# Altium integrated library ALTIUM-PHD_2_54_DUAL_SOCKET_HEADER_6130XX21821.IntLib: 198 symbols (part 1 of 2) (continued)
## 610012243021
designator J?
WR-PHD 2.54 mm SMT Dual Socket Header Bottom Entry, 12p; Part Number: 610012243021; Pin Number: 12; Rated Current: 3A; Working Voltage: 250V AC; Withstanding Voltage: 500V AC; Pitch: 2.54mm; ComponentLink1Description: Manufacturer; ComponentLink1URL: http://www.we-online.de; ComponentLink2Description: Datasheet; ComponentLink2URL: http://katalog.we-online.de/em/datasheet/6100xx243021.pdf; Published Date: August 2017; Publisher: Wurth Elektronik
footprint 610012243021
pins: 1, 2, 3, 4, 5, 6, 7, 8, 9, 10, 11, 12

## 610016243021
designator J?
WR-PHD 2.54 mm SMT Dual Socket Header Bottom Entry, 16p; Part Number: 610016243021; Pin Number: 16; Rated Current: 3A; Working Voltage: 250V AC; Withstanding Voltage: 500V AC; Pitch: 2.54mm; ComponentLink1Description: Manufacturer; ComponentLink1URL: http://www.we-online.de; ComponentLink2Description: Datasheet; ComponentLink2URL: http://katalog.we-online.de/em/datasheet/6100xx243021.pdf; Published Date: August 2017; Publisher: Wurth Elektronik
footprint 610016243021
pins: 1, 2, 3, 4, 5, 6, 7, 8, 9, 10, 11, 12, 13, 14, 15, 16

## 610018243021
designator J?
WR-PHD 2.54 mm SMT Dual Socket Header Bottom Entry, 18p; Part Number: 610018243021; Pin Number: 18; Rated Current: 3A; Working Voltage: 250V AC; Withstanding Voltage: 500V AC; Pitch: 2.54mm; ComponentLink1Description: Manufacturer; ComponentLink1URL: http://www.we-online.de; ComponentLink2Description: Datasheet; ComponentLink2URL: http://katalog.we-online.de/em/datasheet/6100xx243021.pdf; Published Date: August 2017; Publisher: Wurth Elektronik
footprint 610018243021
pins: 1, 2, 3, 4, 5, 6, 7, 8, 9, 10, 11, 12, 13, 14, 15, 16, 17, 18

## 610020243021
designator J?
WR-PHD 2.54 mm SMT Dual Socket Header Bottom Entry, 20p; Part Number: 610020243021; Pin Number: 20; Rated Current: 3A; Working Voltage: 250V AC; Withstanding Voltage: 500V AC; Pitch: 2.54mm; ComponentLink1Description: Manufacturer; ComponentLink1URL: http://www.we-online.de; ComponentLink2Description: Datasheet; ComponentLink2URL: http://katalog.we-online.de/em/datasheet/6100xx243021.pdf; Published Date: August 2017; Publisher: Wurth Elektronik
footprint 610020243021
pins: 1, 2, 3, 4, 5, 6, 7, 8, 9, 10, 11, 12, 13, 14, 15, 16, 17, 18, 19, 20

## 610022243021
designator J?
WR-PHD 2.54 mm SMT Dual Socket Header Bottom Entry, 22p; Part Number: 610022243021; Pin Number: 22; Rated Current: 3A; Working Voltage: 250V AC; Withstanding Voltage: 500V AC; Pitch: 2.54mm; ComponentLink1Description: Manufacturer; ComponentLink1URL: http://www.we-online.de; ComponentLink2Description: Datasheet; ComponentLink2URL: http://katalog.we-online.de/em/datasheet/6100xx243021.pdf; Published Date: August 2017; Publisher: Wurth Elektronik
footprint 610022243021
pins: 1, 2, 3, 4, 5, 6, 7, 8, 9, 10, 11, 12, 13, 14, 15, 16, 17, 18, 19, 20, 21, 22

## 610024243021
designator J?
WR-PHD 2.54 mm SMT Dual Socket Header Bottom Entry, 24p; Part Number: 610024243021; Pin Number: 24; Rated Current: 3A; Working Voltage: 250V AC; Withstanding Voltage: 500V AC; Pitch: 2.54mm; ComponentLink1Description: Manufacturer; ComponentLink1URL: http://www.we-online.de; ComponentLink2Description: Datasheet; ComponentLink2URL: http://katalog.we-online.de/em/datasheet/6100xx243021.pdf; Published Date: August 2017; Publisher: Wurth Elektronik
footprint 610024243021
pins: 1, 2, 3, 4, 5, 6, 7, 8, 9, 10, 11, 12, 13, 14, 15, 16, 17, 18, 19, 20, 21, 22, 23, 24

## 610026243021
designator J?
WR-PHD 2.54 mm SMT Dual Socket Header Bottom Entry, 26p; Part Number: 610026243021; Pin Number: 26; Rated Current: 3A; Working Voltage: 250V AC; Withstanding Voltage: 500V AC; Pitch: 2.54mm; ComponentLink1Description: Manufacturer; ComponentLink1URL: http://www.we-online.de; ComponentLink2Description: Datasheet; ComponentLink2URL: http://katalog.we-online.de/em/datasheet/6100xx243021.pdf; Published Date: August 2017; Publisher: Wurth Elektronik
footprint 610026243021
pins: 1, 2, 3, 4, 5, 6, 7, 8, 9, 10, 11, 12, 13, 14, 15, 16, 17, 18, 19, 20, 21, 22, 23, 24, 25, 26

## 610032243021
designator J?
WR-PHD 2.54 mm SMT Dual Socket Header Bottom Entry, 32p; Part Number: 610032243021; Pin Number: 32; Rated Current: 3A; Working Voltage: 250V AC; Withstanding Voltage: 500V AC; Pitch: 2.54mm; ComponentLink1Description: Manufacturer; ComponentLink1URL: http://www.we-online.de; ComponentLink2Description: Datasheet; ComponentLink2URL: http://katalog.we-online.de/em/datasheet/6100xx243021.pdf; Published Date: August 2017; Publisher: Wurth Elektronik
footprint 610032243021
pins: 1, 2, 3, 4, 5, 6, 7, 8, 9, 10, 11, 12, 13, 14, 15, 16, 17, 18, 19, 20, 21, 22, 23, 24, 25, 26, 27, 28, 29, 30, 31, 32

## 610034243021
designator J?
WR-PHD 2.54 mm SMT Dual Socket Header Bottom Entry, 34p; Part Number: 610034243021; Pin Number: 34; Rated Current: 3A; Working Voltage: 250V AC; Withstanding Voltage: 500V AC; Pitch: 2.54mm; ComponentLink1Description: Manufacturer; ComponentLink1URL: http://www.we-online.de; ComponentLink2Description: Datasheet; ComponentLink2URL: http://katalog.we-online.de/em/datasheet/6100xx243021.pdf; Published Date: August 2017; Publisher: Wurth Elektronik
footprint 610034243021
pins: 1, 2, 3, 4, 5, 6, 7, 8, 9, 10, 11, 12, 13, 14, 15, 16, 17, 18, 19, 20, 21, 22, 23, 24, 25, 26, 27, 28, 29, 30, 31, 32, 33, 34


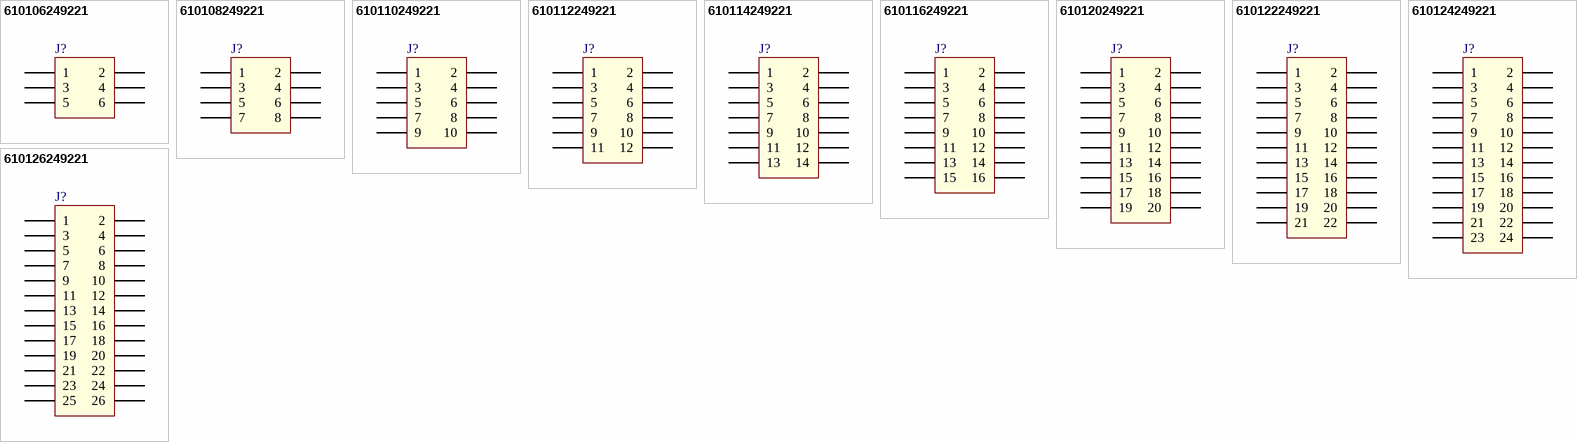
[diagram p4: symbols 610106249221 to 610126249221]

## 610106249221
designator J?
WR-PHD 2.54 mm PCB Socket Header, SMT Type, Double Row, Right Angle, 6p; Part Number: 610106249221; Pin Number: 6; Rated Current: 3A; Working Voltage: 250V AC; Withstanding Voltage: 600V AC; Pitch: 2.54mm; ComponentLink1Description: Manufacturer; ComponentLink1URL: http://www.we-online.de; ComponentLink2Description: Datasheet; ComponentLink2URL: http://katalog.we-online.de/em/datasheet/6101xx249221.pdf; Published Date: August 2017; Publisher: Wurth Elektronik
footprint 610106249221
pins: 1, 2, 3, 4, 5, 6

## 610108249221
designator J?
WR-PHD 2.54 mm PCB Socket Header, SMT Type, Double Row, Right Angle, 8p; Part Number: 610108249221; Pin Number: 8; Rated Current: 3A; Working Voltage: 250V AC; Withstanding Voltage: 600V AC; Pitch: 2.54mm; ComponentLink1Description: Manufacturer; ComponentLink1URL: http://www.we-online.de; ComponentLink2Description: Datasheet; ComponentLink2URL: http://katalog.we-online.de/em/datasheet/6101xx249221.pdf; Published Date: August 2017; Publisher: Wurth Elektronik
footprint 610108249221
pins: 1, 2, 3, 4, 5, 6, 7, 8

## 610110249221
designator J?
WR-PHD 2.54 mm PCB Socket Header, SMT Type, Double Row, Right Angle, 10p; Part Number: 610110249221; Pin Number: 10; Rated Current: 3A; Working Voltage: 250V AC; Withstanding Voltage: 600V AC; Pitch: 2.54mm; ComponentLink1Description: Manufacturer; ComponentLink1URL: http://www.we-online.de; ComponentLink2Description: Datasheet; ComponentLink2URL: http://katalog.we-online.de/em/datasheet/6101xx249221.pdf; Published Date: August 2017; Publisher: Wurth Elektronik
footprint 610110249221
pins: 1, 2, 3, 4, 5, 6, 7, 8, 9, 10

## 610112249221
designator J?
WR-PHD 2.54 mm PCB Socket Header, SMT Type, Double Row, Right Angle, 12p; Part Number: 610112249221; Pin Number: 12; Rated Current: 3A; Working Voltage: 250V AC; Withstanding Voltage: 600V AC; Pitch: 2.54mm; ComponentLink1Description: Manufacturer; ComponentLink1URL: http://www.we-online.de; ComponentLink2Description: Datasheet; ComponentLink2URL: http://katalog.we-online.de/em/datasheet/6101xx249221.pdf; Published Date: August 2017; Publisher: Wurth Elektronik
footprint 610112249221
pins: 1, 2, 3, 4, 5, 6, 7, 8, 9, 10, 11, 12

## 610114249221
designator J?
WR-PHD 2.54 mm PCB Socket Header, SMT Type, Double Row, Right Angle, 14p; Part Number: 610114249221; Pin Number: 14; Rated Current: 3A; Working Voltage: 250V AC; Withstanding Voltage: 600V AC; Pitch: 2.54mm; ComponentLink1Description: Manufacturer; ComponentLink1URL: http://www.we-online.de; ComponentLink2Description: Datasheet; ComponentLink2URL: http://katalog.we-online.de/em/datasheet/6101xx249221.pdf; Published Date: August 2017; Publisher: Wurth Elektronik
footprint 610114249221
pins: 1, 2, 3, 4, 5, 6, 7, 8, 9, 10, 11, 12, 13, 14

## 610116249221
designator J?
WR-PHD 2.54 mm PCB Socket Header, SMT Type, Double Row, Right Angle, 16p; Part Number: 610116249221; Pin Number: 16; Rated Current: 3A; Working Voltage: 250V AC; Withstanding Voltage: 600V AC; Pitch: 2.54mm; ComponentLink1Description: Manufacturer; ComponentLink1URL: http://www.we-online.de; ComponentLink2Description: Datasheet; ComponentLink2URL: http://katalog.we-online.de/em/datasheet/6101xx249221.pdf; Published Date: August 2017; Publisher: Wurth Elektronik
footprint 610116249221
pins: 1, 2, 3, 4, 5, 6, 7, 8, 9, 10, 11, 12, 13, 14, 15, 16

## 610120249221
designator J?
WR-PHD 2.54 mm PCB Socket Header, SMT Type, Double Row, Right Angle, 20p; Part Number: 610120249221; Pin Number: 20; Rated Current: 3A; Working Voltage: 250V AC; Withstanding Voltage: 600V AC; Pitch: 2.54mm; ComponentLink1Description: Manufacturer; ComponentLink1URL: http://www.we-online.de; ComponentLink2Description: Datasheet; ComponentLink2URL: http://katalog.we-online.de/em/datasheet/6101xx249221.pdf; Published Date: August 2017; Publisher: Wurth Elektronik
footprint 610120249221
pins: 1, 2, 3, 4, 5, 6, 7, 8, 9, 10, 11, 12, 13, 14, 15, 16, 17, 18, 19, 20

## 610122249221
designator J?
WR-PHD 2.54 mm PCB Socket Header, SMT Type, Double Row, Right Angle, 22p; Part Number: 610122249221; Pin Number: 22; Rated Current: 3A; Working Voltage: 250V AC; Withstanding Voltage: 600V AC; Pitch: 2.54mm; ComponentLink1Description: Manufacturer; ComponentLink1URL: http://www.we-online.de; ComponentLink2Description: Datasheet; ComponentLink2URL: http://katalog.we-online.de/em/datasheet/6101xx249221.pdf; Published Date: August 2017; Publisher: Wurth Elektronik
footprint 610122249221
pins: 1, 2, 3, 4, 5, 6, 7, 8, 9, 10, 11, 12, 13, 14, 15, 16, 17, 18, 19, 20, 21, 22

## 610124249221
designator J?
WR-PHD 2.54 mm PCB Socket Header, SMT Type, Double Row, Right Angle, 24p; Part Number: 610124249221; Pin Number: 24; Rated Current: 3A; Working Voltage: 250V AC; Withstanding Voltage: 600V AC; Pitch: 2.54mm; ComponentLink1Description: Manufacturer; ComponentLink1URL: http://www.we-online.de; ComponentLink2Description: Datasheet; ComponentLink2URL: http://katalog.we-online.de/em/datasheet/6101xx249221.pdf; Published Date: August 2017; Publisher: Wurth Elektronik
footprint 610124249221
pins: 1, 2, 3, 4, 5, 6, 7, 8, 9, 10, 11, 12, 13, 14, 15, 16, 17, 18, 19, 20, 21, 22, 23, 24

## 610126249221
designator J?
WR-PHD 2.54 mm PCB Socket Header, SMT Type, Double Row, Right Angle, 26p; Part Number: 610126249221; Pin Number: 26; Rated Current: 3A; Working Voltage: 250V AC; Withstanding Voltage: 600V AC; Pitch: 2.54mm; ComponentLink1Description: Manufacturer; ComponentLink1URL: http://www.we-online.de; ComponentLink2Description: Datasheet; ComponentLink2URL: http://katalog.we-online.de/em/datasheet/6101xx249221.pdf; Published Date: August 2017; Publisher: Wurth Elektronik
footprint 610126249221
pins: 1, 2, 3, 4, 5, 6, 7, 8, 9, 10, 11, 12, 13, 14, 15, 16, 17, 18, 19, 20, 21, 22, 23, 24, 25, 26


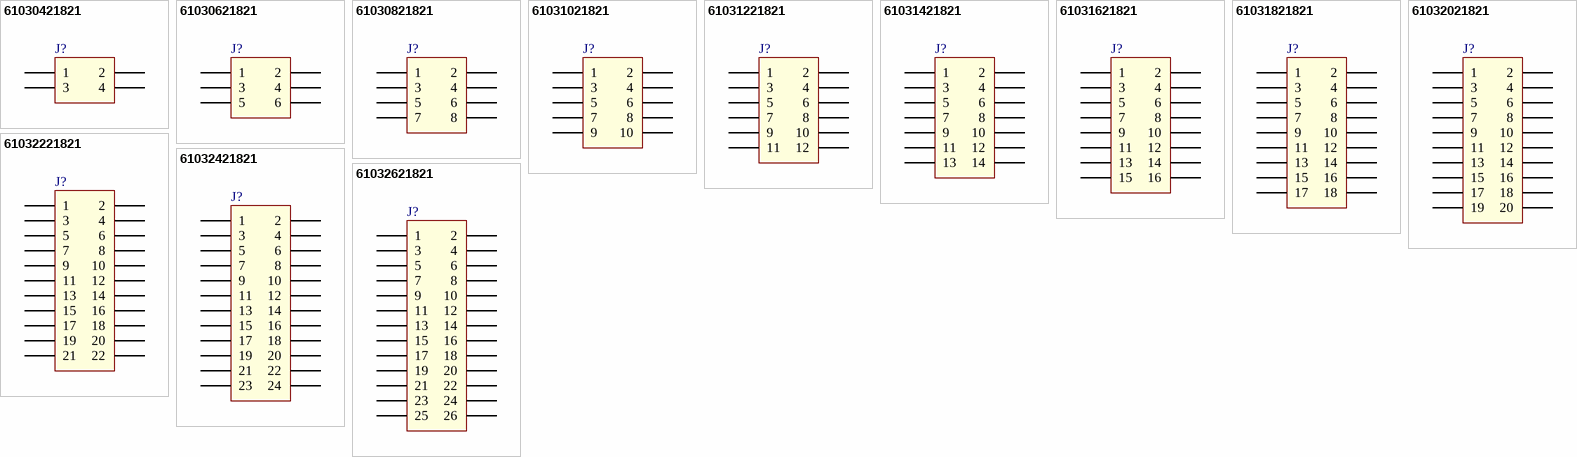
[diagram p5: symbols 61030421821 to 61032621821]

## 61030421821
designator J?
WR-PHD 2.54 mm Dual SMT Socket Header, 4p; Part Number: 61030421821; Pin Number: 4; Rated Current: 3A; Working Voltage: 250V AC; Withstanding Voltage: 600V AC; Pitch: 2.54mm; ComponentLink1Description: Manufacturer; ComponentLink1URL: http://www.we-online.de; ComponentLink2Description: Datasheet; ComponentLink2URL: http://katalog.we-online.de/em/datasheet/6103xx21821.pdf; Published Date: August 2017; Publisher: Wurth Elektronik
footprint 61030421821
pins: 1, 2, 3, 4

## 61030621821
designator J?
WR-PHD 2.54 mm Dual SMT Socket Header, 6p; Part Number: 61030621821; Pin Number: 6; Rated Current: 3A; Working Voltage: 250V AC; Withstanding Voltage: 600V AC; Pitch: 2.54mm; ComponentLink1Description: Manufacturer; ComponentLink1URL: http://www.we-online.de; ComponentLink2Description: Datasheet; ComponentLink2URL: http://katalog.we-online.de/em/datasheet/6103xx21821.pdf; Published Date: August 2017; Publisher: Wurth Elektronik
footprint 61030621821
pins: 1, 2, 3, 4, 5, 6

## 61030821821
designator J?
WR-PHD 2.54 mm Dual SMT Socket Header, 8p; Part Number: 61030821821; Pin Number: 8; Rated Current: 3A; Working Voltage: 250V AC; Withstanding Voltage: 600V AC; Pitch: 2.54mm; ComponentLink1Description: Manufacturer; ComponentLink1URL: http://www.we-online.de; ComponentLink2Description: Datasheet; ComponentLink2URL: http://katalog.we-online.de/em/datasheet/6103xx21821.pdf; Published Date: August 2017; Publisher: Wurth Elektronik
footprint 61030821821
pins: 1, 2, 3, 4, 5, 6, 7, 8

## 61031021821
designator J?
WR-PHD 2.54 mm Dual SMT Socket Header, 10p; Part Number: 61031021821; Pin Number: 10; Rated Current: 3A; Working Voltage: 250V AC; Withstanding Voltage: 600V AC; Pitch: 2.54mm; ComponentLink1Description: Manufacturer; ComponentLink1URL: http://www.we-online.de; ComponentLink2Description: Datasheet; ComponentLink2URL: http://katalog.we-online.de/em/datasheet/6103xx21821.pdf; Published Date: August 2017; Publisher: Wurth Elektronik
footprint 61031021821
pins: 1, 2, 3, 4, 5, 6, 7, 8, 9, 10

## 61031221821
designator J?
WR-PHD 2.54 mm Dual SMT Socket Header, 12p; Part Number: 61031221821; Pin Number: 12; Rated Current: 3A; Working Voltage: 250V AC; Withstanding Voltage: 600V AC; Pitch: 2.54mm; ComponentLink1Description: Manufacturer; ComponentLink1URL: http://www.we-online.de; ComponentLink2Description: Datasheet; ComponentLink2URL: http://katalog.we-online.de/em/datasheet/6103xx21821.pdf; Published Date: August 2017; Publisher: Wurth Elektronik
footprint 61031221821
pins: 1, 2, 3, 4, 5, 6, 7, 8, 9, 10, 11, 12

## 61031421821
designator J?
WR-PHD 2.54 mm Dual SMT Socket Header, 14p; Part Number: 61031421821; Pin Number: 14; Rated Current: 3A; Working Voltage: 250V AC; Withstanding Voltage: 600V AC; Pitch: 2.54mm; ComponentLink1Description: Manufacturer; ComponentLink1URL: http://www.we-online.de; ComponentLink2Description: Datasheet; ComponentLink2URL: http://katalog.we-online.de/em/datasheet/6103xx21821.pdf; Published Date: August 2017; Publisher: Wurth Elektronik
footprint 61031421821
pins: 1, 2, 3, 4, 5, 6, 7, 8, 9, 10, 11, 12, 13, 14

## 61031621821
designator J?
WR-PHD 2.54 mm Dual SMT Socket Header, 16p; Part Number: 61031621821; Pin Number: 16; Rated Current: 3A; Working Voltage: 250V AC; Withstanding Voltage: 600V AC; Pitch: 2.54mm; ComponentLink1Description: Manufacturer; ComponentLink1URL: http://www.we-online.de; ComponentLink2Description: Datasheet; ComponentLink2URL: http://katalog.we-online.de/em/datasheet/6103xx21821.pdf; Published Date: August 2017; Publisher: Wurth Elektronik
footprint 61031621821
pins: 1, 2, 3, 4, 5, 6, 7, 8, 9, 10, 11, 12, 13, 14, 15, 16

## 61031821821
designator J?
WR-PHD 2.54 mm Dual SMT Socket Header, 18p; Part Number: 61031821821; Pin Number: 18; Rated Current: 3A; Working Voltage: 250V AC; Withstanding Voltage: 600V AC; Pitch: 2.54mm; ComponentLink1Description: Manufacturer; ComponentLink1URL: http://www.we-online.de; ComponentLink2Description: Datasheet; ComponentLink2URL: http://katalog.we-online.de/em/datasheet/6103xx21821.pdf; Published Date: August 2017; Publisher: Wurth Elektronik
footprint 61031821821
pins: 1, 2, 3, 4, 5, 6, 7, 8, 9, 10, 11, 12, 13, 14, 15, 16, 17, 18

## 61032021821
designator J?
WR-PHD 2.54 mm Dual SMT Socket Header, 20p; Part Number: 61032021821; Pin Number: 20; Rated Current: 3A; Working Voltage: 250V AC; Withstanding Voltage: 600V AC; Pitch: 2.54mm; ComponentLink1Description: Manufacturer; ComponentLink1URL: http://www.we-online.de; ComponentLink2Description: Datasheet; ComponentLink2URL: http://katalog.we-online.de/em/datasheet/6103xx21821.pdf; Published Date: August 2017; Publisher: Wurth Elektronik
footprint 61032021821
pins: 1, 2, 3, 4, 5, 6, 7, 8, 9, 10, 11, 12, 13, 14, 15, 16, 17, 18, 19, 20

## 61032221821
designator J?
WR-PHD 2.54 mm Dual SMT Socket Header, 22p; Part Number: 61032221821; Pin Number: 22; Rated Current: 3A; Working Voltage: 250V AC; Withstanding Voltage: 600V AC; Pitch: 2.54mm; ComponentLink1Description: Manufacturer; ComponentLink1URL: http://www.we-online.de; ComponentLink2Description: Datasheet; ComponentLink2URL: http://katalog.we-online.de/em/datasheet/6103xx21821.pdf; Published Date: August 2017; Publisher: Wurth Elektronik
footprint 61032221821
pins: 1, 2, 3, 4, 5, 6, 7, 8, 9, 10, 11, 12, 13, 14, 15, 16, 17, 18, 19, 20, 21, 22

## 61032421821
designator J?
WR-PHD 2.54 mm Dual SMT Socket Header, 24p; Part Number: 61032421821; Pin Number: 24; Rated Current: 3A; Working Voltage: 250V AC; Withstanding Voltage: 600V AC; Pitch: 2.54mm; ComponentLink1Description: Manufacturer; ComponentLink1URL: http://www.we-online.de; ComponentLink2Description: Datasheet; ComponentLink2URL: http://katalog.we-online.de/em/datasheet/6103xx21821.pdf; Published Date: August 2017; Publisher: Wurth Elektronik
footprint 61032421821
pins: 1, 2, 3, 4, 5, 6, 7, 8, 9, 10, 11, 12, 13, 14, 15, 16, 17, 18, 19, 20, 21, 22, 23, 24

## 61032621821
designator J?
WR-PHD 2.54 mm Dual SMT Socket Header, 26p; Part Number: 61032621821; Pin Number: 26; Rated Current: 3A; Working Voltage: 250V AC; Withstanding Voltage: 600V AC; Pitch: 2.54mm; ComponentLink1Description: Manufacturer; ComponentLink1URL: http://www.we-online.de; ComponentLink2Description: Datasheet; ComponentLink2URL: http://katalog.we-online.de/em/datasheet/6103xx21821.pdf; Published Date: August 2017; Publisher: Wurth Elektronik
footprint 61032621821
pins: 1, 2, 3, 4, 5, 6, 7, 8, 9, 10, 11, 12, 13, 14, 15, 16, 17, 18, 19, 20, 21, 22, 23, 24, 25, 26


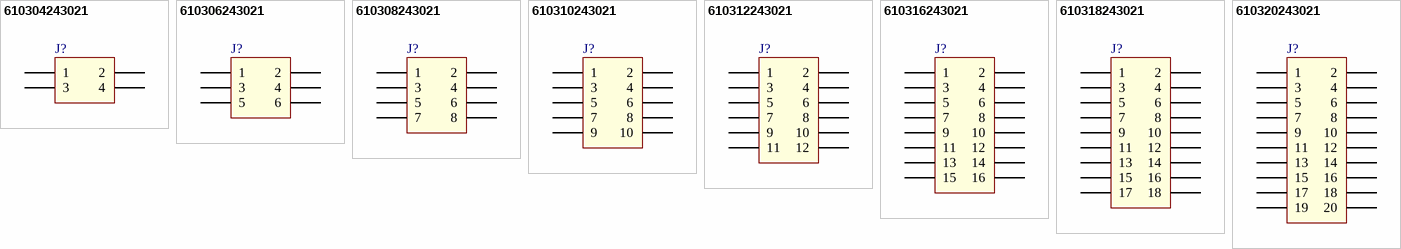
[diagram p6: symbols 610304243021 to 610320243021]

## 610304243021
designator J?
WR-PHD 2.54 mm SMT Dual Socket Header Bottom Entry, 4p; Part Number: 610304243021; Pin Number: 4; Rated Current: 3A; Working Voltage: 250V AC; Withstanding Voltage: 500V AC; Pitch: 2.54mm; ComponentLink1Description: Manufacturer; ComponentLink1URL: http://www.we-online.de; ComponentLink2Description: Datasheet; ComponentLink2URL: http://katalog.we-online.de/em/datasheet/6103xx243021.pdf; Published Date: August 2017; Publisher: Wurth Elektronik
footprint 610304243021
pins: 1, 2, 3, 4

## 610306243021
designator J?
WR-PHD 2.54 mm SMT Dual Socket Header Bottom Entry, 6p; Part Number: 610306243021; Pin Number: 6; Rated Current: 3A; Working Voltage: 250V AC; Withstanding Voltage: 500V AC; Pitch: 2.54mm; ComponentLink1Description: Manufacturer; ComponentLink1URL: http://www.we-online.de; ComponentLink2Description: Datasheet; ComponentLink2URL: http://katalog.we-online.de/em/datasheet/6103xx243021.pdf; Published Date: August 2017; Publisher: Wurth Elektronik
footprint 610306243021
pins: 1, 2, 3, 4, 5, 6

## 610308243021
designator J?
WR-PHD 2.54 mm SMT Dual Socket Header Bottom Entry, 8p; Part Number: 610308243021; Pin Number: 8; Rated Current: 3A; Working Voltage: 250V AC; Withstanding Voltage: 500V AC; Pitch: 2.54mm; ComponentLink1Description: Manufacturer; ComponentLink1URL: http://www.we-online.de; ComponentLink2Description: Datasheet; ComponentLink2URL: http://katalog.we-online.de/em/datasheet/6103xx243021.pdf; Published Date: August 2017; Publisher: Wurth Elektronik
footprint 610308243021
pins: 1, 2, 3, 4, 5, 6, 7, 8

## 610310243021
designator J?
WR-PHD 2.54 mm SMT Dual Socket Header Bottom Entry, 10p; Part Number: 610310243021; Pin Number: 10; Rated Current: 3A; Working Voltage: 250V AC; Withstanding Voltage: 500V AC; Pitch: 2.54mm; ComponentLink1Description: Manufacturer; ComponentLink1URL: http://www.we-online.de; ComponentLink2Description: Datasheet; ComponentLink2URL: http://katalog.we-online.de/em/datasheet/6103xx243021.pdf; Published Date: August 2017; Publisher: Wurth Elektronik
footprint 610310243021
pins: 1, 2, 3, 4, 5, 6, 7, 8, 9, 10

## 610312243021
designator J?
WR-PHD 2.54 mm SMT Dual Socket Header Bottom Entry, 12p; Part Number: 610312243021; Pin Number: 12; Rated Current: 3A; Working Voltage: 250V AC; Withstanding Voltage: 500V AC; Pitch: 2.54mm; ComponentLink1Description: Manufacturer; ComponentLink1URL: http://www.we-online.de; ComponentLink2Description: Datasheet; ComponentLink2URL: http://katalog.we-online.de/em/datasheet/6103xx243021.pdf; Published Date: August 2017; Publisher: Wurth Elektronik
footprint 610312243021
pins: 1, 2, 3, 4, 5, 6, 7, 8, 9, 10, 11, 12

## 610316243021
designator J?
WR-PHD 2.54 mm SMT Dual Socket Header Bottom Entry, 16p; Part Number: 610316243021; Pin Number: 16; Rated Current: 3A; Working Voltage: 250V AC; Withstanding Voltage: 500V AC; Pitch: 2.54mm; ComponentLink1Description: Manufacturer; ComponentLink1URL: http://www.we-online.de; ComponentLink2Description: Datasheet; ComponentLink2URL: http://katalog.we-online.de/em/datasheet/6103xx243021.pdf; Published Date: August 2017; Publisher: Wurth Elektronik
footprint 610316243021
pins: 1, 2, 3, 4, 5, 6, 7, 8, 9, 10, 11, 12, 13, 14, 15, 16

## 610318243021
designator J?
WR-PHD 2.54 mm SMT Dual Socket Header Bottom Entry, 18p; Part Number: 610318243021; Pin Number: 18; Rated Current: 3A; Working Voltage: 250V AC; Withstanding Voltage: 500V AC; Pitch: 2.54mm; ComponentLink1Description: Manufacturer; ComponentLink1URL: http://www.we-online.de; ComponentLink2Description: Datasheet; ComponentLink2URL: http://katalog.we-online.de/em/datasheet/6103xx243021.pdf; Published Date: August 2017; Publisher: Wurth Elektronik
footprint 610318243021
pins: 1, 2, 3, 4, 5, 6, 7, 8, 9, 10, 11, 12, 13, 14, 15, 16, 17, 18

## 610320243021
designator J?
WR-PHD 2.54 mm SMT Dual Socket Header Bottom Entry, 20p; Part Number: 610320243021; Pin Number: 20; Rated Current: 3A; Working Voltage: 250V AC; Withstanding Voltage: 500V AC; Pitch: 2.54mm; ComponentLink1Description: Manufacturer; ComponentLink1URL: http://www.we-online.de; ComponentLink2Description: Datasheet; ComponentLink2URL: http://katalog.we-online.de/em/datasheet/6103xx243021.pdf; Published Date: August 2017; Publisher: Wurth Elektronik
footprint 610320243021
pins: 1, 2, 3, 4, 5, 6, 7, 8, 9, 10, 11, 12, 13, 14, 15, 16, 17, 18, 19, 20


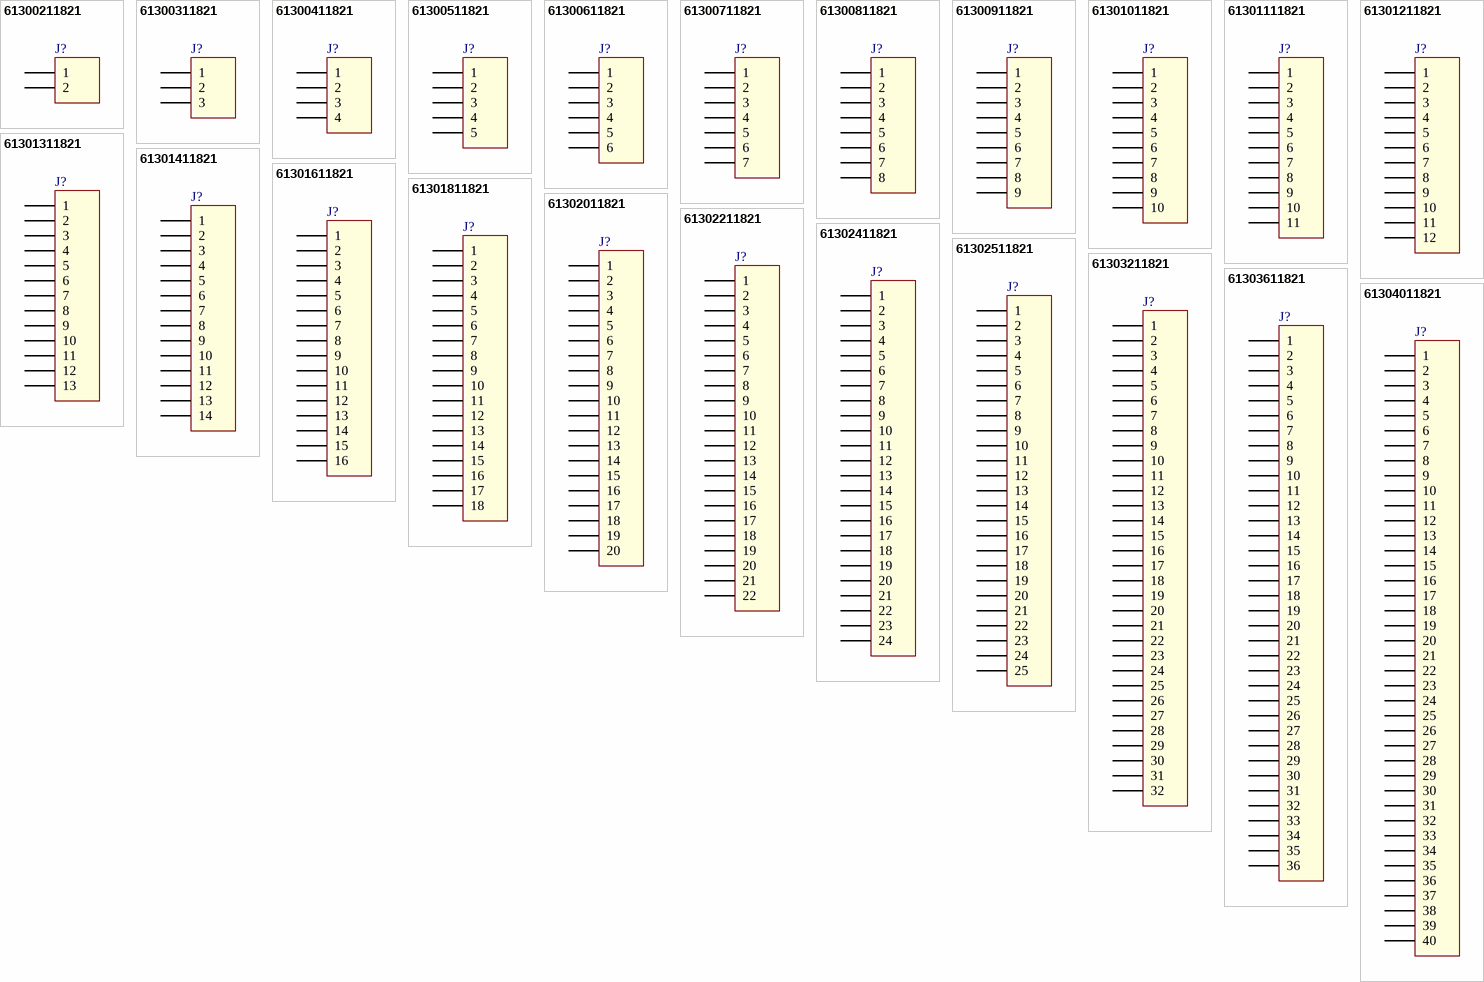
[diagram p7: symbols 61300211821 to 61304011821]

## 61300211821
designator J?
WR-PHD 2.54 mm Socket Header, 2p; Part Number: 61300211821; Pin Number: 2; Rated Current: 3A; Working Voltage: 250V AC; Withstanding Voltage: 500V AC; Pitch: 2.54mm; ComponentLink1Description: Manufacturer; ComponentLink1URL: http://www.we-online.de; ComponentLink2Description: Datasheet; ComponentLink2URL: http://katalog.we-online.de/em/datasheet/6130xx11821.pdf; Published Date: August 2017; Publisher: Wurth Elektronik
footprint 61300211821
pins: 1, 2

## 61300311821
designator J?
WR-PHD 2.54 mm Socket Header, 3p; Part Number: 61300311821; Pin Number: 3; Rated Current: 3A; Working Voltage: 250V AC; Withstanding Voltage: 500V AC; Pitch: 2.54mm; ComponentLink1Description: Manufacturer; ComponentLink1URL: http://www.we-online.de; ComponentLink2Description: Datasheet; ComponentLink2URL: http://katalog.we-online.de/em/datasheet/6130xx11821.pdf; Published Date: August 2017; Publisher: Wurth Elektronik
footprint 61300311821
pins: 1, 2, 3
